# Altium footprint library pw.PcbLib: 210 footprints (part 11 of 14)
Each footprint in its own frame and in the unit in brackets; x right, y up, seen from the top. Pads: shape width x height; smd on the part's side, far side on the other; paste and mask are expansions set on the pad; w line width, h text height; cw(c..) or ccw(c..) is an arc to the next point about the centre after c.
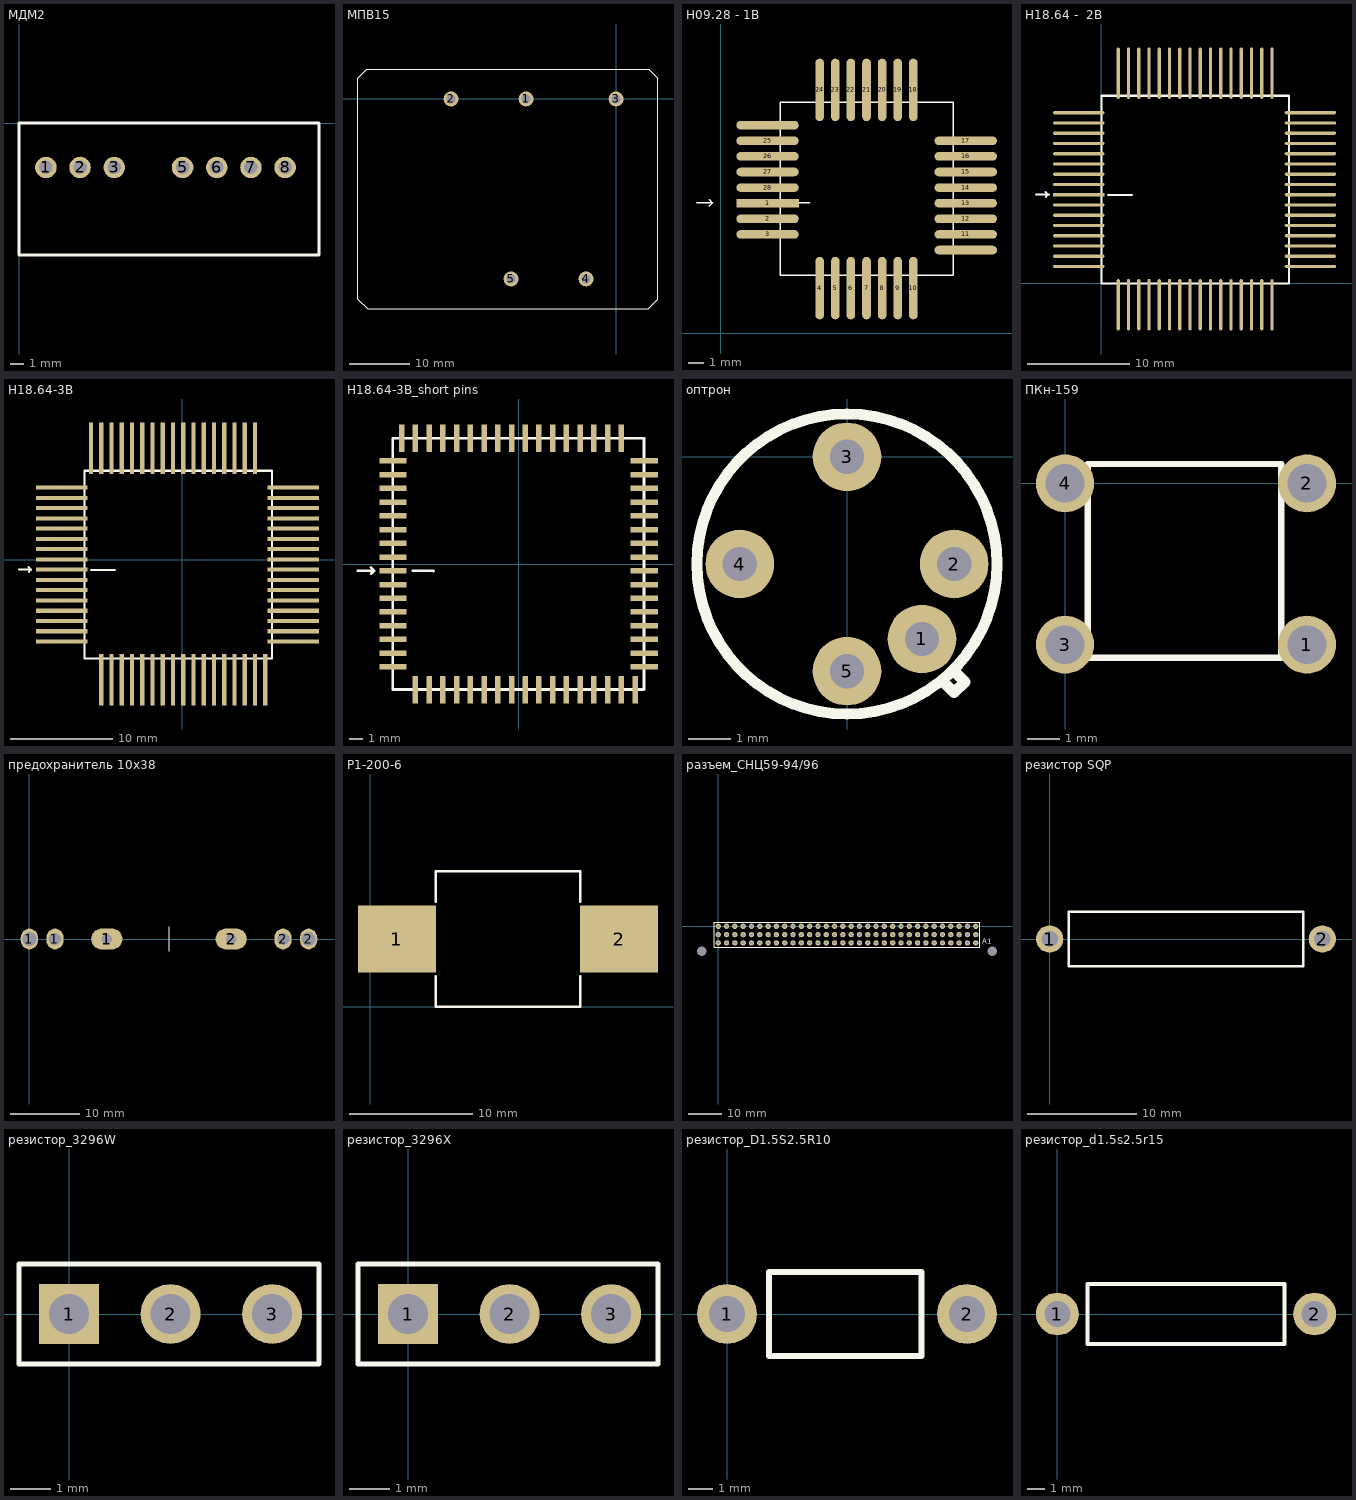
[diagram p10: the footprints below, top view; thin cyan lines are the x and y axes]

## МДМ2 [mm]
height 12.1
pads (7):
  round 1.6 hole 1: 1(2,-3.3) 2(4.54,-3.3) 3(7.08,-3.3) 5(12.16,-3.3) 6(14.7,-3.3) 7(17.24,-3.3) 8(19.78,-3.3)
Top Overlay:
  lines w0.2: 0,-9.8 0,0 22.3,0 22.3,-9.8 0,-9.8
3D body: height 12.1, standoff 0, extent 0,-9.8 22.3,0

## МПВ15 [mm] "DC/DC ИРБИС"
pads (5):
  round 2.5 hole 1.5: 1(-15,0) 2(-27.5,0) 3(0,0) 4(-5,-30) 5(-17.5,-30)
Top Overlay:
  lines w0.2: 6.98,-33.41 5.38,-35.01 -41.42,-35.01 -43.02,-33.41 -43.02,3.49 -41.52,4.99 5.48,4.99 6.98,3.49 ; 7,-33.41 7,3.49
3D body: height 11.5, standoff 0, extent -43.02,-35.01 6.98,4.99

## Н09.28 - 1B [mm]
pads (30):
  rect 4x0.55 smd: 1(3,8.34)
  oval 4x0.55 smd: 2(3,7.34) 3(3,6.34) 11(15.7,6.34) 12(15.7,7.34) 13(15.7,8.34) 14(15.7,9.34) 15(15.7,10.34) 16(15.7,11.34) 17(15.7,12.34) 25(3,12.34) 26(3,11.34) 27(3,10.34) 28(3,9.34) ""(3,13.34) ""(15.7,5.34)
  oval 0.55x4 smd: 4(6.34,2.9) 5(7.34,2.9) 6(8.34,2.9) 7(9.34,2.9) 8(10.34,2.9) 9(11.34,2.9) 10(12.34,2.9) 18(12.34,15.6) 19(11.34,15.6) 20(10.34,15.6) 21(9.34,15.6) 22(8.34,15.6) 23(7.34,15.6) 24(6.34,15.6)
Top Overlay:
  lines w0.1: -1.52,8.36 -0.52,8.36 -0.53,8.36 ; -0.74,8.57 -0.53,8.36 ; -0.73,8.16 -0.53,8.36 ; 4.29,8.37 5.7,8.37 ; -0.53,8.36 -0.53,8.36 ; 3.8,3.73 14.9,3.73 14.9,14.8 3.8,14.8 3.8,3.73
3D body "User Library-N09_28-1V.stp": height 3, standoff 0, extent 1.84,1.8 16.84,16.8

## Н18.64 -  2В [mm]
pads (64):
  rect 5x0.32 smd: 1(-2.2,8.65)
  oval 5x0.32 smd: 2(-2.2,7.65) 3(-2.2,6.65) 4(-2.2,5.65) 5(-2.2,4.65) 6(-2.2,3.65) 7(-2.2,2.65) 8(-2.2,1.65) 25(20.39,1.65) 26(20.39,2.65) 27(20.39,3.65) 28(20.39,4.65) 29(20.39,5.65) 30(20.39,6.65) 31(20.39,7.65) 32(20.39,8.65) 33(20.39,9.65) 34(20.39,10.65) 35(20.39,11.65) 36(20.39,12.65) 37(20.39,13.65) 38(20.39,14.65) 39(20.39,15.65) 40(20.39,16.65) 57(-2.2,16.65) 58(-2.2,15.65) 59(-2.2,14.65) 60(-2.2,13.65) 61(-2.2,12.65) 62(-2.2,11.65) 63(-2.2,10.65) 64(-2.2,9.65)
  oval 0.32x5 smd: 9(1.65,-2.08) 10(2.65,-2.08) 11(3.65,-2.08) 12(4.65,-2.08) 13(5.65,-2.08) 14(6.65,-2.08) 15(7.65,-2.08) 16(8.65,-2.08) 17(9.65,-2.09) 18(10.65,-2.09) 19(11.65,-2.09) 20(12.65,-2.09) 21(13.65,-2.09) 22(14.65,-2.09) 23(15.65,-2.09) 24(16.65,-2.09) 41(16.65,20.5) 42(15.65,20.5) 43(14.65,20.5) 44(13.65,20.5) 45(12.65,20.5) 46(11.65,20.5) 47(10.65,20.5) 48(9.65,20.5) 49(8.65,20.5) 50(7.65,20.5) 51(6.65,20.5) 52(5.65,20.5) 53(4.65,20.5) 54(3.65,20.5) 55(2.65,20.5) 56(1.65,20.5)
Top Overlay:
  lines w0.2: -6.37,8.66 -5.11,8.66 -5.2,8.66 -5.41,8.45 ; -5.43,8.9 -5.21,8.68 -5.21,8.66 ; 0.65,8.64 2.97,8.64 ; 0,0 18.3,0 18.3,18.3 0,18.3 0,0
3D body: height 3.6, standoff 0, extent 0,0.01 18.3,18.29

## Н18.64-3В [mm]
pads (66):
  rect 5x0.4 smd: 1(-11.768,-0.965) 2(-11.768,-1.965) 3(-11.768,-2.965) 4(-11.768,-3.965) 5(-11.768,-4.965) 6(-11.768,-5.965) 7(-11.768,-6.965) 8(-11.768,-7.965) 25(10.822,-7.965) 26(10.822,-6.965) 27(10.822,-5.965) 28(10.822,-4.965) 29(10.822,-3.965) 30(10.822,-2.965) 31(10.822,-1.965) 32(10.822,-0.965) 33(10.822,0.035) 34(10.822,1.035) 35(10.822,2.035) 36(10.822,3.035) 37(10.822,4.035) 38(10.822,5.035) 39(10.822,6.035) 40(10.822,7.035) 57(-11.768,7.035) 58(-11.768,6.035) 59(-11.768,5.035) 60(-11.768,4.035) 61(-11.768,3.035) 62(-11.768,2.035) 63(-11.768,1.035) 64(-11.768,0.035)
  rect 0.4x5 smd: 9(-7.918,-11.695) 10(-6.918,-11.695) 11(-5.918,-11.695) 12(-4.918,-11.695) 13(-3.918,-11.695) 14(-2.918,-11.695) 15(-1.918,-11.695) 16(-0.918,-11.695) 17(0.082,-11.705) 18(1.082,-11.705) 19(2.082,-11.705) 20(3.082,-11.705) 21(4.082,-11.705) 22(5.082,-11.705) 23(6.082,-11.705) 24(7.082,-11.705) 41(7.082,10.885) 42(6.082,10.885) 43(5.082,10.885) 44(4.082,10.885) 45(3.082,10.885) 46(2.082,10.885) 47(1.082,10.885) 48(0.082,10.885) 49(-0.918,10.885) 50(-1.918,10.885) 51(-2.918,10.885) 52(-3.918,10.885) 53(-4.918,10.885) 54(-5.918,10.885) 55(-6.918,10.885) 56(-7.918,10.885) TP1(-8.918,10.885) TP2(8.082,-11.705)
Top Overlay:
  lines w0.2: -15.938,-0.955 -14.768,-0.955 -14.978,-1.165 ; -14.998,-0.715 -14.778,-0.935 -14.778,-0.955 ; -8.918,-0.975 -6.598,-0.975 ; -9.568,-9.615 -9.568,8.685 8.732,8.685 8.732,-9.615 -9.568,-9.615
3D body "User Library-H18_64-3B.step": height 3, standoff -0.05, extent -11.054,-11.13 10.246,10.17

## Н18.64-3В_short pins [mm]
pads (66):
  rect 2x0.4 smd: 1(-9.14,-0.495) 2(-9.14,-1.495) 3(-9.14,-2.495) 4(-9.14,-3.495) 5(-9.14,-4.495) 6(-9.14,-5.495) 7(-9.14,-6.495) 8(-9.14,-7.495) 25(9.16,-7.495) 26(9.16,-6.495) 27(9.16,-5.495) 28(9.16,-4.495) 29(9.16,-3.495) 30(9.16,-2.495) 31(9.16,-1.495) 32(9.16,-0.495) 33(9.16,0.505) 34(9.16,1.505) 35(9.16,2.505) 36(9.16,3.505) 37(9.16,4.505) 38(9.16,5.505) 39(9.16,6.505) 40(9.16,7.505) 57(-9.14,7.505) 58(-9.14,6.505) 59(-9.14,5.505) 60(-9.14,4.505) 61(-9.14,3.505) 62(-9.14,2.505) 63(-9.14,1.505) 64(-9.14,0.505)
  rect 0.4x2 smd: 9(-7.508,-9.15) 10(-6.508,-9.15) 11(-5.508,-9.15) 12(-4.508,-9.15) 13(-3.508,-9.15) 14(-2.508,-9.15) 15(-1.508,-9.15) 16(-0.508,-9.15) 17(0.492,-9.15) 18(1.492,-9.15) 19(2.492,-9.15) 20(3.492,-9.15) 21(4.492,-9.15) 22(5.492,-9.15) 23(6.492,-9.15) 24(7.492,-9.15) 41(7.492,9.15) 42(6.492,9.15) 43(5.492,9.15) 44(4.492,9.15) 45(3.492,9.15) 46(2.492,9.15) 47(1.492,9.15) 48(0.492,9.15) 49(-0.508,9.15) 50(-1.508,9.15) 51(-2.508,9.15) 52(-3.508,9.15) 53(-4.508,9.15) 54(-5.508,9.15) 55(-6.508,9.15) 56(-7.508,9.15) TP1(-8.508,9.15) TP2(8.492,-9.15)
Top Overlay:
  lines w0.2: -11.69,-0.5 -10.52,-0.5 -10.73,-0.71 ; -10.75,-0.26 -10.53,-0.48 -10.53,-0.5 ; -7.7,-0.5 -6.188,-0.505 ; -9.158,-9.145 9.142,-9.145 9.142,9.155 -9.158,9.155 -9.158,-9.145
3D body "User Library-H18_64-3B-0.5.stp": height 3, standoff -0.05, extent -9.65,-9.65 9.65,9.65

## оптрон [mm]
pads (5):
  round 1.6 hole 0.8: 1(1.75,-4.25) 2(2.5,-2.5) 3(0,0) 4(-2.5,-2.5) 5(0,-5)
Top Overlay:
  circle w0.254: c0,-2.5 r3.5
  lines w0.254: 2.25,-5.25 2.5,-5.5 2.75,-5.25 2.5,-5

## ПКн-159 [mm]
pads (4):
  round 1.8 hole 1.2: 1(7.5,-5) 2(7.5,0) 3(0,-5) 4(0,0)
Top Overlay:
  lines w0.2: 0.7,-5.4 6.7,-5.4 6.7,0.6 0.7,0.6 0.7,-5.4
3D body "User Library-FSM8JH.step": height 9.5, standoff -3.51, extent -0.128,-5.425 7.67,0.565

## предохранитель 10х38 [mm]
pads (6):
  oval 2.5x3 hole 2: 1(0,0) 2(40.4,0)
  oval 2.5x3 hole 1.8: 1(3.7,0) 2(36.7,0)
  oval 4.5x3 hole 1.5 square: 1(11.2,0) 2(29.2,0)
Top Overlay:
  lines w0.1: 20.2,-1.75 20.2,1.75
3D body "Стойка продохран.STEP": height 18.76, standoff -3.94, extent -0.95,-8 41.45,8.113

## Р1-200-6 [mm]
height 1
pads (2):
  rect 6.3x5.4 smd: 1(2.15,5.5) 2(20.15,5.5)
Top Overlay:
  lines w0.2: 5.3,2.5 5.3,0 17,0 17,2.5 ; 5.3,8.5 5.3,11 17,11 17,8.5
3D body: height 0.8, standoff 0, extent 5.3,0 17,11
3D body: height 0.2, standoff 0, extent 17,2.8 22.3,8.2
3D body: height 0.2, standoff 0, extent 0,2.8 5.3,8.2

## разъем_СНЦ59-94/96 [mm]
pads (98):
  round 1.6 hole 0.8: A1(77.5,-5) A2(75,-5) A3(72.5,-5) A4(70,-5) A5(67.5,-5) A6(65,-5) A7(62.5,-5) A8(60,-5) A9(57.5,-5) A10(55,-5) A11(52.5,-5) A12(50,-5) A13(47.5,-5) A14(45,-5) A15(42.5,-5) A16(40,-5) A17(37.5,-5) A18(35,-5) A19(32.5,-5) A20(30,-5) A21(27.5,-5) A22(25,-5) A23(22.5,-5) A24(20,-5) A25(17.5,-5) A26(15,-5) A27(12.5,-5) A28(10,-5) A29(7.5,-5) A30(5,-5) A31(2.5,-5) A32(0,-5) B1(77.5,-2.5) B2(75,-2.5) B3(72.5,-2.5) B4(70,-2.5) B5(67.5,-2.5) B6(65,-2.5) B7(62.5,-2.5) B8(60,-2.5) B9(57.5,-2.5) B10(55,-2.5) B11(52.5,-2.5) B12(50,-2.5) B13(47.5,-2.5) B14(45,-2.5) B15(42.5,-2.5) B16(40,-2.5) B17(37.5,-2.5) B18(35,-2.5) B19(32.5,-2.5) B20(30,-2.5) B21(27.5,-2.5) B22(25,-2.5) B23(22.5,-2.5) B24(20,-2.5) B25(17.5,-2.5) B26(15,-2.5) B27(12.5,-2.5) B28(10,-2.5) B29(7.5,-2.5) B30(5,-2.5) B31(2.5,-2.5) B32(0,-2.5) C1(77.5,0) C2(75,0) C3(72.5,0) C4(70,0) C5(67.5,0) C6(65,0) C7(62.5,0) C8(60,0) C9(57.5,0) C10(55,0) C11(52.5,0) C12(50,0) C13(47.5,0) C14(45,0) C15(42.5,0) C16(40,0) C17(37.5,0) C18(35,0) C19(32.5,0) C20(30,0) C21(27.5,0) C22(25,0) C23(22.5,0) C24(20,0) C25(17.5,0) C26(15,0) C27(12.5,0) C28(10,0) C29(7.5,0) C30(5,0) C31(2.5,0) C32(0,0)
  round 1.6 hole 2.8 unplated: ""(-5,-7.5) ""(82.5,-7.5)
Top Overlay:
  lines w0.254: -1.25,-6.25 -1.25,1.25 78.75,1.25 78.75,-6.25 -1.25,-6.25
  text "1" at 81,-5.25 h1.52
  text "A" at 79.5,-5.25 h1.52

## резистор SQP [mm]
pads (2):
  round 2.5 hole 1.5: 1(0,0) 2(25,0)
Top Overlay:
  lines w0.254: 1.75,-2.5 23.25,-2.5 23.25,2.5 1.75,2.5 1.75,-2.5
3D body "User Library-SQP-5W.STEP": height 9.21, standoff -2.5, extent -0.7,-4.7 25.7,5

## резистор_3296W [mm] "подстроечный"
pads (3):
  rect 1.5x1.5 hole 1: 1(0,0)
  round 1.5 hole 1: 2(2.54,0) 3(5.08,0)
Top Overlay:
  lines w0.125: -1.25,-1.25 6.25,-1.25 6.25,1.25 -1.25,1.25 -1.25,-1.25
3D body "User Library-3296W.STEP": height 11.55, standoff -1.6, extent -2.225,-2.4 7.305,2.4

## резистор_3296X [mm]
pads (3):
  rect 1.5x1.5 hole 1: 1(0,0)
  round 1.5 hole 1: 2(2.54,0) 3(5.08,0)
Top Overlay:
  lines w0.125: -1.25,-1.25 6.25,-1.25 6.25,1.25 -1.25,1.25 -1.25,-1.25
3D body "3296X.stp": height 10, standoff -6.43, extent -2.249,-2.4 8.8,2.426

## резистор_D1.5S2.5R10 [mm]
pads (2):
  round 2.5 hole 1.5: 1(0,0) 2(10,0)
Top Overlay:
  lines w0.254: 1.75,-1.75 8.1,-1.75 8.1,1.75 7.063,1.75 1.75,1.75 1.75,-1.75

## резистор_d1.5s2.5r15 [mm]
pads (2):
  round 2.5 hole 1.5: 1(0,0) 2(15,0)
Top Overlay:
  lines w0.254: 1.75,-1.75 13.25,-1.75 13.25,1.75 7.063,1.75 1.75,1.75 1.75,-1.75
3D body "RESAD1500W60L900D320_0.5W.STEP": height 3.6, standoff -2.75, extent -0.3,-1.6 15.3,1.6